# Altium footprint library Connectors_rus.PcbLib: 53 footprints (part 3 of 4)
Each footprint in its own frame and in the unit in brackets; x right, y up, seen from the top. Pads: shape width x height; smd on the part's side, far side on the other; paste and mask are expansions set on the pad; w line width, h text height; cw(c..) or ccw(c..) is an arc to the next point about the centre after c.
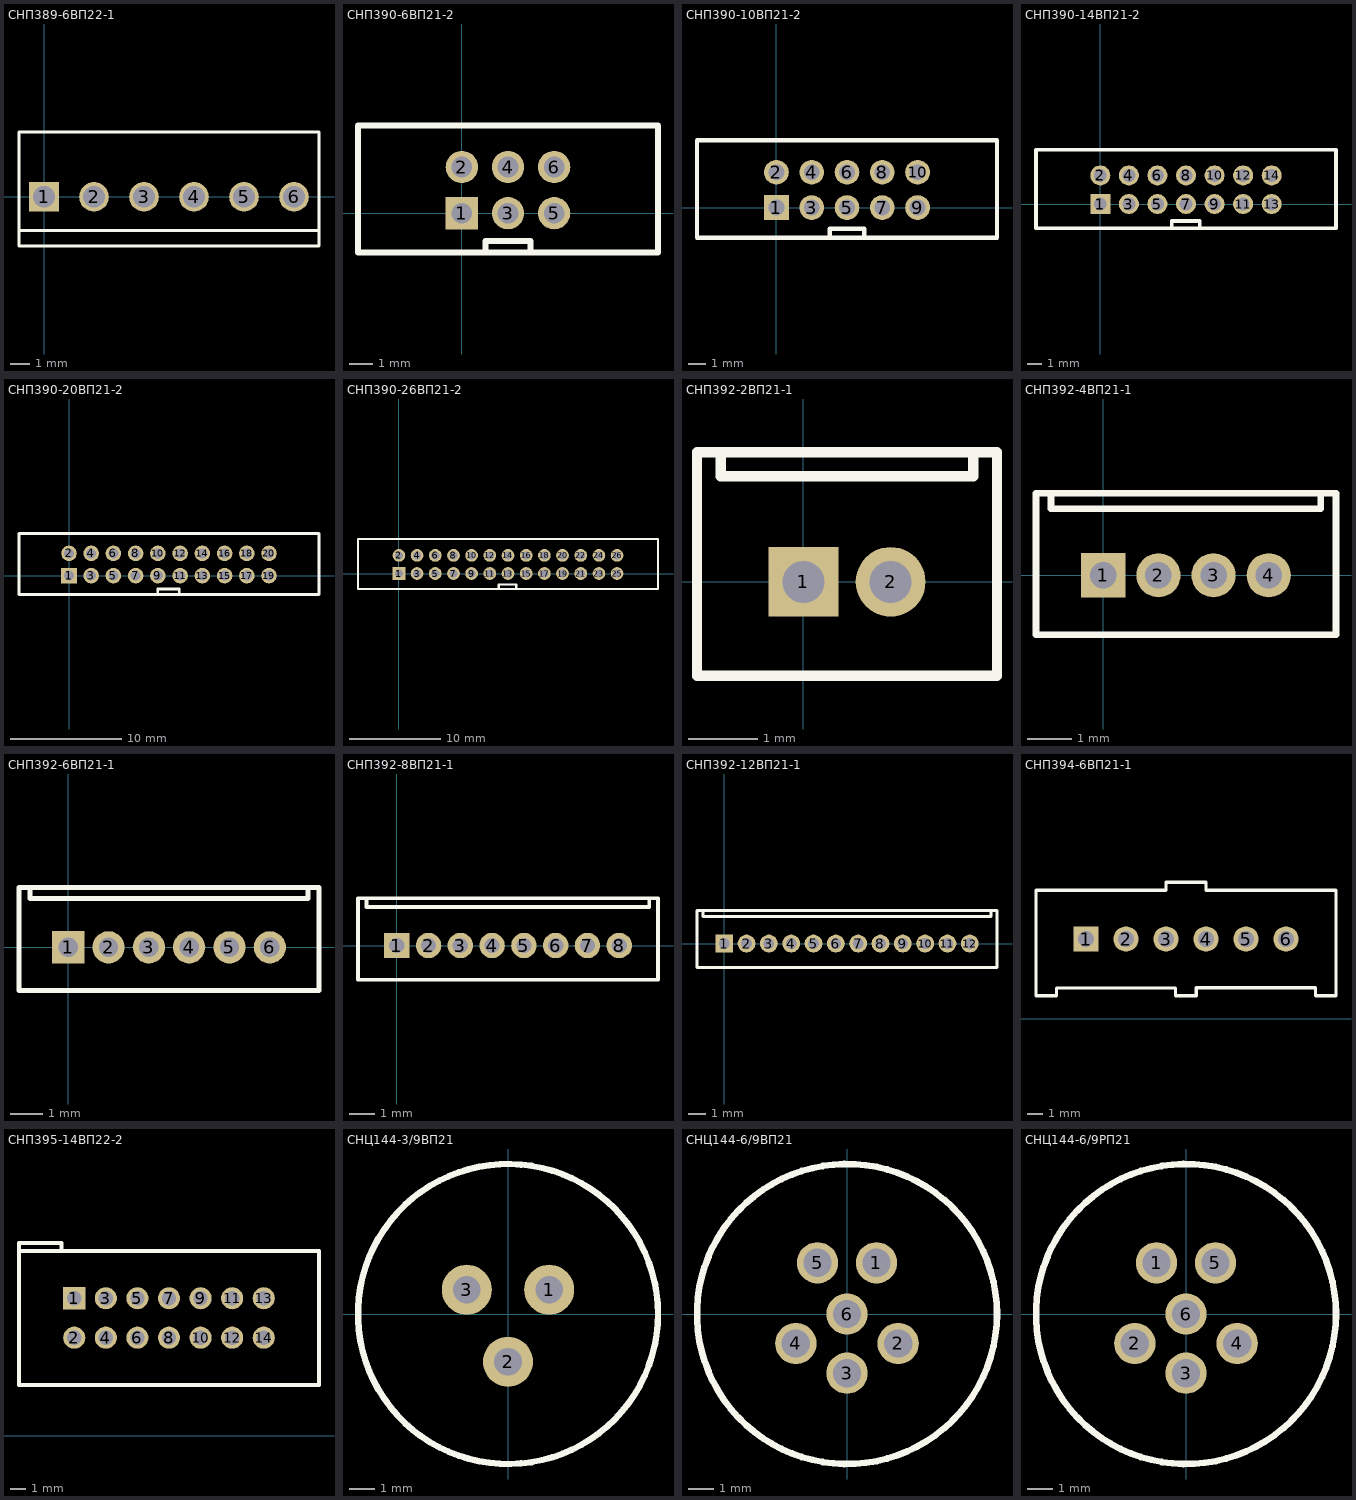
[diagram p2: the footprints below, top view; thin cyan lines are the x and y axes]

## СНП389-6ВП22-1 [mm]
pads (6):
  rect 1.5x1.5 hole 1.1: 1(0,0)
  round 1.5 hole 1.1: 2(2.54,0) 3(5.08,0) 4(7.62,0) 5(10.16,0) 6(12.7,0)
Top Overlay:
  lines w0.15: -1.27,-1.7 -1.27,-2.5 ; -1.25,-1.7 13.97,-1.7 ; -1.27,-2.5 -1.27,3.3 13.97,3.3 13.97,-2.5 -1.27,-2.5
3D body "User Library-WF-6.step": height 11.87, standoff -2.53, extent -1.277,-2.612 13.963,3.188

## СНП390-6ВП21-2 [mm]
pads (6):
  rect 1.4x1.4 hole 0.9: 1(0,0)
  round 1.4 hole 0.9: 2(0,2) 3(2,0) 4(2,2) 5(4,0) 6(4,2)
Top Overlay:
  lines w0.254: 1.03,-1.6 1.03,-1.2 2.97,-1.2 2.97,-1.57 ; -4.5,-1.7 8.5,-1.7 8.5,3.8 -4.5,3.8 -4.5,-1.7
3D body: height 5.7, standoff 0, extent -4.5,3.48 8.5,3.8
3D body: height 5.7, standoff 0, extent -4.5,-1.8 1.03,-1.48
3D body: height 5.7, standoff 0, extent 2.97,-1.8 8.5,-1.48
3D body: height 5.7, standoff 0, extent -4.5,-1.8 -4.18,3.8
3D body: height 5.7, standoff 0, extent 8.18,-1.8 8.5,3.8
3D body: height 2.5, standoff 0, extent -4.5,-1.8 8.5,-1.48
3D body: height 5.4, standoff -1.5, extent -0.26,1.74 0.26,2.26
3D body: height 5.4, standoff -1.5, extent -0.26,-0.26 0.26,0.26
3D body: height 5.4, standoff -1.5, extent 1.74,1.74 2.26,2.26
3D body: height 5.4, standoff -1.5, extent 1.74,-0.26 2.26,0.26
3D body: height 5.4, standoff -1.5, extent 3.74,1.74 4.26,2.26
3D body: height 5.4, standoff -1.5, extent 3.74,-0.26 4.26,0.26
3D body: height 1.4, standoff 0, extent -4.5,-1.7 8.5,3.8

## СНП390-10ВП21-2 [mm]
pads (10):
  rect 1.4x1.4 hole 0.9: 1(0,0)
  round 1.4 hole 0.9: 2(0,2) 3(2,0) 4(2,2) 5(4,0) 6(4,2) 7(6,0) 8(6,2) 9(8,0) 10(8,2)
Top Overlay:
  lines w0.254: 3.03,-1.6 3.03,-1.2 4.97,-1.2 4.97,-1.57 ; -4.5,-1.7 12.5,-1.7 12.5,3.8 -4.5,3.8 -4.5,-1.7
3D body "User Library-BH2-xx10-64.step": height 5.65, standoff -3.6, extent -4.54,-1.72 12.46,3.73

## СНП390-14ВП21-2 [mm]
pads (14):
  rect 1.4x1.4 hole 0.9: 1(0,0)
  round 1.4 hole 0.9: 2(0,2) 3(2,0) 4(2,2) 5(4,0) 6(4,2) 7(6,0) 8(6,2) 9(8,0) 10(8,2) 11(10,0) 12(10,2) 13(12,0) 14(12,2)
Top Overlay:
  lines w0.254: 5.01,-1.59 5.01,-1.19 6.95,-1.19 6.95,-1.56 ; -4.5,-1.7 -4.5,3.8 16.5,3.8 16.5,-1.7 -4.5,-1.7
3D body "User Library-BH2-xx10-64(2).step": height 5.65, standoff -3.6, extent -4.44,-1.725 16.56,3.725

## СНП390-20ВП21-2 [mm]
pads (20):
  rect 1.4x1.4 hole 0.9: 1(0,0)
  round 1.4 hole 0.9: 2(0,2) 3(2,0) 4(2,2) 5(4,0) 6(4,2) 7(6,0) 8(6,2) 9(8,0) 10(8,2) 11(10,0) 12(10,2) 13(12,0) 14(12,2) 15(14,0) 16(14,2) 17(16,0) 18(16,2) 19(18,0) 20(18,2)
Top Overlay:
  lines w0.254: 7.98,-1.6 7.98,-1.2 9.92,-1.2 9.92,-1.57 ; -4.5,-1.7 22.5,-1.7 22.5,3.8 -4.5,3.8 -4.5,-1.7
3D body "User Library-BH2-xx.step": height 5.65, standoff -3.6, extent -4.5,-1.725 22.5,3.725

## СНП390-26ВП21-2 [mm]
pads (26):
  rect 1.4x1.4 hole 0.9: 1(0,0)
  round 1.4 hole 0.9: 2(0,2) 3(2,0) 4(2,2) 5(4,0) 6(4,2) 7(6,0) 8(6,2) 9(8,0) 10(8,2) 11(10,0) 12(10,2) 13(12,0) 14(12,2) 15(14,0) 16(14,2) 17(16,0) 18(16,2) 19(18,0) 20(18,2) 21(20,0) 22(20,2) 23(22,0) 24(22,2) 25(24,0) 26(24,2)
Top Overlay:
  lines w0.254: 10.98,-1.6 10.98,-1.2 12.92,-1.2 12.92,-1.57 ; -4.5,-1.7 28.5,-1.7 28.5,3.8 -4.5,3.8 -4.5,-1.7
3D body "User Library-BH2-xx.step": height 5.65, standoff -3.6, extent -4.5,-1.7 28.5,3.75

## СНП392-2ВП21-1 [mm]
pads (2):
  rect 1x1 hole 0.6: 1(0,0)
  round 1 hole 0.6: 2(1.25,0)
Top Overlay:
  lines w0.15: -1.176,1.841 -1.185,1.841 -1.185,1.511 2.432,1.511 2.432,1.849 ; -1.525,-1.344 -1.525,1.856 2.775,1.856 2.775,-1.344 1.258,-1.344 -1.525,-1.344
3D body: height 3.9, standoff -1.8, extent 1.086,-0.193 1.406,0.177
3D body: height 0.2, standoff 0, extent -1.603,-1.429 2.844,1.922
3D body: height 3.9, standoff -1.8, extent -0.164,-0.193 0.156,0.177
3D body: height 4.2, standoff 0, extent -1.603,1.774 -0.909,1.922
3D body: height 4.2, standoff 0, extent -1.599,-1.428 2.827,-1.277
3D body: height 4.2, standoff 0, extent -1.603,-1.428 -1.453,1.922
3D body: height 3, standoff 0, extent -1.603,1.769 2.827,1.922
3D body: height 4.2, standoff 0, extent 2.155,1.782 2.849,1.93
3D body: height 4.2, standoff 0, extent 2.699,-1.42 2.849,1.93

## СНП392-4ВП21-1 [mm]
pads (4):
  rect 1x1 hole 0.6: 1(0,0)
  round 1 hole 0.6: 2(1.25,0) 3(2.5,0) 4(3.75,0)
Top Overlay:
  lines w0.15: -1.176,1.841 -1.185,1.841 -1.185,1.511 4.932,1.511 4.932,1.849 ; -1.525,-1.344 1.258,-1.344 5.275,-1.344 5.275,1.856 -1.525,1.856 -1.525,-1.344
3D body: height 3, standoff 0, extent -1.599,1.774 5.349,1.93
3D body: height 4.2, standoff 0, extent -1.599,-1.42 -1.449,1.93
3D body: height 4.2, standoff 0, extent -1.595,-1.42 5.342,-1.269
3D body: height 4.2, standoff 0, extent -1.599,1.782 -0.905,1.93
3D body: height 3.9, standoff -1.8, extent -0.16,-0.185 0.16,0.185
3D body: height 0.2, standoff 0, extent -1.599,-1.421 5.349,1.93
3D body: height 3.9, standoff -1.8, extent 1.09,-0.185 1.41,0.185
3D body: height 3.9, standoff -1.8, extent 2.34,-0.185 2.66,0.185
3D body: height 3.9, standoff -1.8, extent 3.59,-0.185 3.91,0.185
3D body: height 4.2, standoff 0, extent 5.199,-1.42 5.349,1.93
3D body: height 4.2, standoff 0, extent 4.655,1.782 5.349,1.93

## СНП392-6ВП21-1 [mm]
pads (6):
  rect 1x1 hole 0.6: 1(0,0)
  round 1 hole 0.6: 2(1.25,0) 3(2.5,0) 4(3.75,0) 5(5,0) 6(6.25,0)
Top Overlay:
  lines w0.15: -1.176,1.841 -1.185,1.841 -1.185,1.511 7.432,1.511 7.432,1.849 ; -1.525,-1.344 -1.525,1.856 7.775,1.856 7.775,-1.344 1.258,-1.344 -1.525,-1.344
3D body: height 4.2, standoff 0, extent 7.155,1.782 7.849,1.93
3D body: height 4.2, standoff 0, extent 7.699,-1.42 7.849,1.93
3D body: height 3.9, standoff -1.8, extent 6.09,-0.185 6.41,0.185
3D body: height 3.9, standoff -1.8, extent 4.84,-0.185 5.16,0.185
3D body: height 3.9, standoff -1.8, extent 3.59,-0.185 3.91,0.185
3D body: height 3.9, standoff -1.8, extent 2.34,-0.185 2.66,0.185
3D body: height 3.9, standoff -1.8, extent 1.09,-0.185 1.41,0.185
3D body: height 0.2, standoff 0, extent -1.599,-1.421 7.848,1.93
3D body: height 3.9, standoff -1.8, extent -0.16,-0.185 0.16,0.185
3D body: height 3, standoff 0, extent -1.599,1.771 7.849,1.93
3D body: height 4.2, standoff 0, extent -1.599,1.782 -0.905,1.93
3D body: height 4.2, standoff 0, extent -1.595,-1.42 7.85,-1.269
3D body: height 4.2, standoff 0, extent -1.599,-1.42 -1.449,1.93

## СНП392-8ВП21-1 [mm]
pads (8):
  rect 1x1 hole 0.6: 1(0,0)
  round 1 hole 0.6: 2(1.25,0) 3(2.5,0) 4(3.75,0) 5(5,0) 6(6.25,0) 7(7.5,0) 8(8.75,0)
Top Overlay:
  lines w0.15: -1.176,1.841 -1.185,1.841 -1.185,1.511 9.932,1.511 9.932,1.849 ; -1.525,-1.344 1.258,-1.344 10.275,-1.344 10.275,1.856 -1.525,1.856 -1.525,-1.344
3D body: height 4.2, standoff 0, extent -1.599,-1.42 -1.449,1.93
3D body: height 4.2, standoff 0, extent 10.199,-1.42 10.349,1.93
3D body: height 4.2, standoff 0, extent -1.599,-1.42 10.349,-1.269
3D body: height 4.2, standoff 0, extent -1.599,1.782 -0.905,1.93
3D body: height 4.2, standoff 0, extent 9.655,1.782 10.349,1.93
3D body: height 3, standoff 0, extent -0.905,1.77 9.655,1.93
3D body: height 3.9, standoff -1.8, extent -0.16,-0.185 0.16,0.185
3D body: height 0.2, standoff 0, extent -1.599,-1.421 10.349,1.93
3D body: height 3.9, standoff -1.8, extent 1.09,-0.185 1.41,0.185
3D body: height 3.9, standoff -1.8, extent 2.34,-0.185 2.66,0.185
3D body: height 3.9, standoff -1.8, extent 3.59,-0.185 3.91,0.185
3D body: height 3.9, standoff -1.8, extent 4.84,-0.185 5.16,0.185
3D body: height 3.9, standoff -1.8, extent 6.09,-0.185 6.41,0.185
3D body: height 3.9, standoff -1.8, extent 7.34,-0.185 7.66,0.185
3D body: height 3.9, standoff -1.8, extent 8.59,-0.185 8.91,0.185

## СНП392-12ВП21-1 [mm]
pads (12):
  rect 1x1 hole 0.6: 1(0,0)
  round 1 hole 0.6: 2(1.25,0) 3(2.5,0) 4(3.75,0) 5(5,0) 6(6.25,0) 7(7.5,0) 8(8.75,0) 9(10,0) 10(11.25,0) 11(12.5,0) 12(13.75,0)
Top Overlay:
  lines w0.15: -1.176,1.841 -1.185,1.841 -1.185,1.511 14.935,1.511 ; 14.935,1.512 14.935,1.85 ; -1.525,-1.344 -1.525,1.856 15.269,1.856 15.275,1.85 15.275,-1.344 1.258,-1.344 -1.525,-1.344
3D body: height 4.2, standoff 0, extent 14.655,1.782 15.349,1.93
3D body: height 3.9, standoff -1.8, extent 12.34,-0.185 12.66,0.185
3D body: height 3.9, standoff -1.8, extent 13.59,-0.185 13.91,0.185
3D body: height 3.9, standoff -1.8, extent 11.09,-0.185 11.41,0.185
3D body: height 3.9, standoff -1.8, extent 9.84,-0.185 10.16,0.185
3D body: height 3.9, standoff -1.8, extent 8.59,-0.185 8.91,0.185
3D body: height 3.9, standoff -1.8, extent 7.34,-0.185 7.66,0.185
3D body: height 4.2, standoff 0, extent 15.199,-1.42 15.349,1.93
3D body: height 3.9, standoff -1.8, extent 6.09,-0.185 6.41,0.185
3D body: height 3.9, standoff -1.8, extent 4.84,-0.185 5.16,0.185
3D body: height 3.9, standoff -1.8, extent 3.59,-0.185 3.91,0.185
3D body: height 3.9, standoff -1.8, extent 2.34,-0.185 2.66,0.185
3D body: height 3.9, standoff -1.8, extent 1.09,-0.185 1.41,0.185
3D body: height 0.2, standoff 0, extent -1.599,-1.421 15.349,1.93
3D body: height 3.9, standoff -1.8, extent -0.16,-0.185 0.16,0.185
3D body: height 3, standoff 0, extent -1.599,1.782 15.349,1.93
3D body: height 4.2, standoff 0, extent -1.599,1.782 -0.905,1.93
3D body: height 4.2, standoff 0, extent -1.595,-1.42 15.349,-1.269
3D body: height 4.2, standoff 0, extent -1.599,-1.42 -1.449,1.93

## СНП394-6ВП21-1 [mm]
pads (6):
  rect 1.6x1.6 hole 1: 1(11.528,5.073)
  round 1.6 hole 1: 2(14.068,5.073) 3(16.608,5.073) 4(19.148,5.073) 5(21.688,5.073) 6(24.228,5.073)
Top Overlay:
  lines w0.2: 8.353,1.953 8.353,1.473 ; 16.608,8.653 16.608,8.173 8.353,8.173 8.353,1.473 ; 16.608,8.673 19.148,8.673 ; 18.528,1.473 17.208,1.473 17.208,1.953 9.653,1.953 9.653,1.473 8.353,1.473 ; 18.528,1.493 18.528,1.973 26.083,1.973 ; 19.148,8.653 19.148,8.173 27.403,8.173 27.403,1.473 ; 26.103,1.953 26.103,1.473 27.403,1.473 ; 27.403,1.953 27.403,1.473
3D body: height 9.8, standoff -2.9, extent 23.918,4.763 24.538,5.383
3D body: height 9.8, standoff -2.9, extent 21.378,4.763 21.998,5.383
3D body: height 9.8, standoff -2.9, extent 18.838,4.763 19.458,5.383
3D body: height 9.8, standoff -2.9, extent 16.298,4.763 16.918,5.383
3D body: height 9.8, standoff -2.9, extent 13.758,4.763 14.378,5.383
3D body: height 9.8, standoff -2.9, extent 11.218,4.763 11.838,5.383
3D body: height 0.5, standoff 0, extent 8.672,2.1 27.078,7.93
3D body: height 10.9, standoff 0, extent 26.079,1.473 27.403,2.282
3D body: height 10.9, standoff 0, extent 17.204,1.473 18.528,2.282
3D body: height 10.9, standoff 0, extent 8.329,1.473 9.653,2.282
3D body: height 10.9, standoff 0, extent 16.608,7.873 19.128,8.653
3D body: height 10.9, standoff 0, extent 26.828,2.073 27.328,8.073
3D body: height 10.9, standoff 0, extent 8.428,2.073 8.928,8.073
3D body: height 10.9, standoff 0, extent 8.353,1.973 27.403,2.473
3D body: height 10.9, standoff 0, extent 8.353,7.673 27.403,8.173

## СНП395-14ВП22-2 [mm]
pads (14):
  rect 1.4x1.4 hole 0.9: 1(7,8.7)
  round 1.4 hole 0.9: 2(7,6.2) 3(9,8.7) 4(9,6.2) 5(11,8.7) 6(11,6.2) 7(13,8.7) 8(13,6.2) 9(15,8.7) 10(15,6.2) 11(17,8.7) 12(17,6.2) 13(19,8.7) 14(19,6.2)
Top Overlay:
  lines w0.254: 6.2,11.7 6.2,12.2 3.5,12.2 3.5,11.7 ; 3.5,11.7 22.5,11.7 22.5,3.2 3.5,3.2 3.5,11.7
3D body: height 5.8, standoff -3.5, extent 18.74,5.94 19.26,6.46
3D body: height 5.8, standoff -3.5, extent 18.74,8.44 19.26,8.96
3D body: height 5.8, standoff -3.5, extent 16.74,5.94 17.26,6.46
3D body: height 5.8, standoff -3.5, extent 16.74,8.44 17.26,8.96
3D body: height 5.8, standoff -3.5, extent 14.74,5.94 15.26,6.46
3D body: height 5.8, standoff -3.5, extent 14.74,8.44 15.26,8.96
3D body: height 5.8, standoff -3.5, extent 12.74,5.94 13.26,6.46
3D body: height 5.8, standoff -3.5, extent 12.74,8.44 13.26,8.96
3D body: height 5.8, standoff -3.5, extent 10.74,5.94 11.26,6.46
3D body: height 5.8, standoff -3.5, extent 10.74,8.44 11.26,8.96
3D body: height 5.8, standoff -3.5, extent 8.74,5.94 9.26,6.46
3D body: height 5.8, standoff -3.5, extent 8.74,8.44 9.26,8.96
3D body: height 5.8, standoff -3.5, extent 6.74,8.44 7.26,8.96
3D body: height 5.8, standoff -3.5, extent 6.74,5.94 7.26,6.46
3D body: height 0.2, standoff 0, extent 3.5,3.3 22.5,11.6
3D body: height 6.5, standoff 0, extent 3.4,3.2 3.8,11.8
3D body: height 6.5, standoff 0, extent 22.2,3.2 22.6,11.8
3D body: height 6.5, standoff 0, extent 3.5,3.1 22.5,3.5
3D body: height 6.5, standoff 0, extent 3.5,11.4 22.5,11.8

## СНЦ144-3/9ВП21 [mm]
pads (3):
  round 2 hole 1.1: 1(1.65,0.97) 2(0,-1.91) 3(-1.65,0.97)
Top Overlay:
  circle w0.254: c0,0 r6
Bottom Overlay:
  circle w0.2: c1.65,0.97 r1.25
  text "1" at 1.8,2.5 h1.4
  text "3" at -1.4,2.5 h1.4
  text "2" at 0.2,-4.4 h1.4
3D body "Вилка СНЦ144-3l9ВП21-NFПL.stp": height 34.39, standoff -4.61, extent -11.9,-11.93 11.9,11.87

## СНЦ144-6/9ВП21 [mm]
pads (6):
  round 1.6 hole 1.1: 1(1.14,1.98) 2(1.98,-1.14) 3(0,-2.29) 4(-1.98,-1.14) 5(-1.14,1.98) 6(0,0)
Top Overlay:
  circle w0.254: c0,0 r5.801
Bottom Overlay:
  circle w0.2: c1.14,1.98 r1.1
  lines w0.15: -2.515,0.992 -0.944,0.274
  text "1" at 1.36,3.47 h1.4
  text "5" at -0.881,3.218 h1.4
  text "6" at -2.817,0.652 h1.4
  text "2" at 3.543,-1.461 h1.4
  text "4" at -3.16,-1.461 h1.4
  text "3" at 0.139,-4.129 h1.4
3D body "Вилка СНЦ144-6l9ВП21-NFПL.stp": height 31.9, standoff -4.6, extent -11.895,-11.922 11.905,11.878

## СНЦ144-6/9РП21 [mm]
pads (6):
  round 1.6 hole 1.1: 1(-1.14,1.98) 2(-1.98,-1.14) 3(0,-2.29) 4(1.98,-1.14) 5(1.14,1.98) 6(0,0)
Top Overlay:
  circle w0.254: c0,0 r5.801
Bottom Overlay:
  circle w0.2: c-1.14,1.98 r1.1
  lines w0.15: 0.997,0.231 2.683,0.759
  text "6" at 3.315,0.458 h1.4
  text "2" at -3.324,-1.464 h1.4
  text "3" at 0.201,-4.208 h1.4
  text "4" at 3.532,-1.526 h1.4
  text "5" at 1.412,2.962 h1.4
  text "1" at -0.86,3.31 h1.4
3D body "Розетка СНЦ144-6l9РП21-NFПL.stp": height 31.9, standoff -4.6, extent -11.901,-11.91 11.899,11.89